# Altium schematic symbol library jlcpcb_2025_04_capacitors_extended_0603.schlib: 3668 symbols (part 9 of 20) (continued)
## CC0603JRNPO0BN391
designator C?  Capacitance: 390pF  (hidden comment: *)
Capacitor, Ceramic (MLCC), 390pF, ±5%, 100V, NP0, ±5%, SMD 0603; Manufacturer: YAGEO; Manufacturer Part Number: CC0603JRNPO0BN391; Package Size: 0603; JLCPCB Basic Part: No; JLCPCB Part Number: C576808; Supplier 1: LCSC; Category: Capacitors - MLCC; Supplier Part Number 1: C576808; Tolerance: ±5%; Voltage Rating: 100V; Temperature Coefficient: NP0; RoHS: Yes; ComponentLink1Description: Datasheet; ComponentLink1URL: https://wmsc.lcsc.com/wmsc/upload/file/pdf/v2/lcsc/2311211121_YAGEO-CC0603JRNPO0BN391_C576808.pdf; ComponentLink2Description: JLCPCB Part URL; ComponentLink2URL: https://jlcpcb.com/partdetail/C576808; ComponentLink3Description: LCSC Part URL; ComponentLink3URL: https://lcsc.com/product-detail/Multilayer-Ceramic-Capacitors-MLCC---SMD-SMT_YAGEO-YAGEO-CC0603JRNPO0BN391_C576808.html
footprint CAP-0603 (0603 (1608M) Capacitor)
pins: 1, 2

## CC0603JRNPO0BN470
designator C?  Capacitance: 47pF  (hidden comment: *)
Capacitor, Ceramic (MLCC), 47pF, ±5%, 100V, NP0, ±5%, SMD 0603; Manufacturer: YAGEO; Manufacturer Part Number: CC0603JRNPO0BN470; Package Size: 0603; JLCPCB Basic Part: No; JLCPCB Part Number: C327115; Supplier 1: LCSC; Category: Capacitors - MLCC; Supplier Part Number 1: C327115; Tolerance: ±5%; Voltage Rating: 100V; Temperature Coefficient: NP0; RoHS: Yes; ComponentLink1Description: Datasheet; ComponentLink1URL: https://wmsc.lcsc.com/wmsc/upload/file/pdf/v2/lcsc/1811141226_YAGEO-CC0603JRNPO0BN470_C327115.pdf; ComponentLink2Description: JLCPCB Part URL; ComponentLink2URL: https://jlcpcb.com/partdetail/C327115; ComponentLink3Description: LCSC Part URL; ComponentLink3URL: https://lcsc.com/product-detail/Multilayer-Ceramic-Capacitors-MLCC---SMD-SMT_YAGEO-YAGEO-CC0603JRNPO0BN470_C327115.html
footprint CAP-0603 (0603 (1608M) Capacitor)
pins: 1, 2

## CC0603JRNPO0BN471
designator C?  Capacitance: 470pF  (hidden comment: *)
Capacitor, Ceramic (MLCC), 470pF, ±5%, 100V, NP0, ±5%, SMD 0603; Manufacturer: YAGEO; Manufacturer Part Number: CC0603JRNPO0BN471; Package Size: 0603; JLCPCB Basic Part: No; JLCPCB Part Number: C326973; Supplier 1: LCSC; Category: Capacitors - MLCC; Supplier Part Number 1: C326973; Tolerance: ±5%; Voltage Rating: 100V; Temperature Coefficient: NP0; RoHS: Yes; ComponentLink1Description: Datasheet; ComponentLink1URL: https://wmsc.lcsc.com/wmsc/upload/file/pdf/v2/lcsc/1811141234_YAGEO-CC0603JRNPO0BN471_C326973.pdf; ComponentLink2Description: JLCPCB Part URL; ComponentLink2URL: https://jlcpcb.com/partdetail/C326973; ComponentLink3Description: LCSC Part URL; ComponentLink3URL: https://lcsc.com/product-detail/Multilayer-Ceramic-Capacitors-MLCC---SMD-SMT_YAGEO-YAGEO-CC0603JRNPO0BN471_C326973.html
footprint CAP-0603 (0603 (1608M) Capacitor)
pins: 1, 2

## CC0603JRNPO0BN510
designator C?  Capacitance: 51pF  (hidden comment: *)
Capacitor, Ceramic (MLCC), 51pF, ±5%, 100V, NP0, ±5%, SMD 0603; Manufacturer: YAGEO; Manufacturer Part Number: CC0603JRNPO0BN510; Package Size: 0603; JLCPCB Basic Part: No; JLCPCB Part Number: C527064; Supplier 1: LCSC; Category: Capacitors - MLCC; Supplier Part Number 1: C527064; Tolerance: ±5%; Voltage Rating: 100V; Temperature Coefficient: NP0; RoHS: Yes; ComponentLink1Description: Datasheet; ComponentLink1URL: https://wmsc.lcsc.com/wmsc/upload/file/pdf/v2/lcsc/2006101834_YAGEO-CC0603JRNPO0BN510_C527064.pdf; ComponentLink2Description: JLCPCB Part URL; ComponentLink2URL: https://jlcpcb.com/partdetail/C527064; ComponentLink3Description: LCSC Part URL; ComponentLink3URL: https://lcsc.com/product-detail/Multilayer-Ceramic-Capacitors-MLCC---SMD-SMT_YAGEO-YAGEO-CC0603JRNPO0BN510_C527064.html
footprint CAP-0603 (0603 (1608M) Capacitor)
pins: 1, 2

## CC0603JRNPO0BN560
designator C?  Capacitance: 56pF  (hidden comment: *)
Capacitor, Ceramic (MLCC), 56pF, ±5%, 100V, NP0, ±5%, SMD 0603; Manufacturer: YAGEO; Manufacturer Part Number: CC0603JRNPO0BN560; Package Size: 0603; JLCPCB Basic Part: No; JLCPCB Part Number: C327031; Supplier 1: LCSC; Category: Capacitors - MLCC; Supplier Part Number 1: C327031; Tolerance: ±5%; Voltage Rating: 100V; Temperature Coefficient: NP0; RoHS: Yes; ComponentLink1Description: Datasheet; ComponentLink1URL: https://wmsc.lcsc.com/wmsc/upload/file/pdf/v2/lcsc/1811141226_YAGEO-CC0603JRNPO0BN560_C327031.pdf; ComponentLink2Description: JLCPCB Part URL; ComponentLink2URL: https://jlcpcb.com/partdetail/C327031; ComponentLink3Description: LCSC Part URL; ComponentLink3URL: https://lcsc.com/product-detail/Multilayer-Ceramic-Capacitors-MLCC---SMD-SMT_YAGEO-YAGEO-CC0603JRNPO0BN560_C327031.html
footprint CAP-0603 (0603 (1608M) Capacitor)
pins: 1, 2

## CC0603JRNPO0BN561
designator C?  Capacitance: 560pF  (hidden comment: *)
Capacitor, Ceramic (MLCC), 560pF, ±5%, 100V, NP0, ±5%, SMD 0603; Manufacturer: YAGEO; Manufacturer Part Number: CC0603JRNPO0BN561; Package Size: 0603; JLCPCB Basic Part: No; JLCPCB Part Number: C513644; Supplier 1: LCSC; Category: Capacitors - MLCC; Supplier Part Number 1: C513644; Tolerance: ±5%; Voltage Rating: 100V; Temperature Coefficient: NP0; RoHS: Yes; ComponentLink1Description: Datasheet; ComponentLink1URL: https://wmsc.lcsc.com/wmsc/upload/file/pdf/v2/lcsc/2004231433_YAGEO-CC0603JRNPO0BN561_C513644.pdf; ComponentLink2Description: JLCPCB Part URL; ComponentLink2URL: https://jlcpcb.com/partdetail/C513644; ComponentLink3Description: LCSC Part URL; ComponentLink3URL: https://lcsc.com/product-detail/Multilayer-Ceramic-Capacitors-MLCC---SMD-SMT_YAGEO-YAGEO-CC0603JRNPO0BN561_C513644.html
footprint CAP-0603 (0603 (1608M) Capacitor)
pins: 1, 2

## CC0603JRNPO0BN680
designator C?  Capacitance: 68pF  (hidden comment: *)
Capacitor, Ceramic (MLCC), 68pF, ±5%, 100V, NP0, ±5%, SMD 0603; Manufacturer: YAGEO; Manufacturer Part Number: CC0603JRNPO0BN680; Package Size: 0603; JLCPCB Basic Part: No; JLCPCB Part Number: C527065; Supplier 1: LCSC; Category: Capacitors - MLCC; Supplier Part Number 1: C527065; Tolerance: ±5%; Voltage Rating: 100V; Temperature Coefficient: NP0; RoHS: Yes; ComponentLink1Description: Datasheet; ComponentLink1URL: https://wmsc.lcsc.com/wmsc/upload/file/pdf/v2/lcsc/2005141733_YAGEO-CC0603JRNPO0BN680_C527065.pdf; ComponentLink2Description: JLCPCB Part URL; ComponentLink2URL: https://jlcpcb.com/partdetail/C527065; ComponentLink3Description: LCSC Part URL; ComponentLink3URL: https://lcsc.com/product-detail/Multilayer-Ceramic-Capacitors-MLCC---SMD-SMT_YAGEO-YAGEO-CC0603JRNPO0BN680_C527065.html
footprint CAP-0603 (0603 (1608M) Capacitor)
pins: 1, 2

## CC0603JRNPO0BN681
designator C?  Capacitance: 680pF  (hidden comment: *)
Capacitor, Ceramic (MLCC), 680pF, ±5%, 100V, NP0, ±5%, SMD 0603; Manufacturer: YAGEO; Manufacturer Part Number: CC0603JRNPO0BN681; Package Size: 0603; JLCPCB Basic Part: No; JLCPCB Part Number: C527066; Supplier 1: LCSC; Category: Capacitors - MLCC; Supplier Part Number 1: C527066; Tolerance: ±5%; Voltage Rating: 100V; Temperature Coefficient: NP0; RoHS: Yes; ComponentLink1Description: Datasheet; ComponentLink1URL: https://wmsc.lcsc.com/wmsc/upload/file/pdf/v2/lcsc/2006101834_YAGEO-CC0603JRNPO0BN681_C527066.pdf; ComponentLink2Description: JLCPCB Part URL; ComponentLink2URL: https://jlcpcb.com/partdetail/C527066; ComponentLink3Description: LCSC Part URL; ComponentLink3URL: https://lcsc.com/product-detail/Multilayer-Ceramic-Capacitors-MLCC---SMD-SMT_YAGEO-YAGEO-CC0603JRNPO0BN681_C527066.html
footprint CAP-0603 (0603 (1608M) Capacitor)
pins: 1, 2

## CC0603JRNPO0BN820
designator C?  Capacitance: 82pF  (hidden comment: *)
Capacitor, Ceramic (MLCC), 82pF, ±5%, 100V, NP0, ±5%, SMD 0603; Manufacturer: YAGEO; Manufacturer Part Number: CC0603JRNPO0BN820; Package Size: 0603; JLCPCB Basic Part: No; JLCPCB Part Number: C113795; Supplier 1: LCSC; Category: Capacitors - MLCC; Supplier Part Number 1: C113795; Tolerance: ±5%; Voltage Rating: 100V; Temperature Coefficient: NP0; RoHS: Yes; ComponentLink1Description: Datasheet; ComponentLink1URL: https://wmsc.lcsc.com/wmsc/upload/file/pdf/v2/lcsc/2304140030_YAGEO-CC0603JRNPO0BN820_C113795.pdf; ComponentLink2Description: JLCPCB Part URL; ComponentLink2URL: https://jlcpcb.com/partdetail/C113795; ComponentLink3Description: LCSC Part URL; ComponentLink3URL: https://lcsc.com/product-detail/Multilayer-Ceramic-Capacitors-MLCC---SMD-SMT_YAGEO-YAGEO-CC0603JRNPO0BN820_C113795.html
footprint CAP-0603 (0603 (1608M) Capacitor)
pins: 1, 2

## CC0603JRNPO0BN821
designator C?  Capacitance: 820pF  (hidden comment: *)
Capacitor, Ceramic (MLCC), 820pF, ±5%, 100V, NP0, ±5%, SMD 0603; Manufacturer: YAGEO; Manufacturer Part Number: CC0603JRNPO0BN821; Package Size: 0603; JLCPCB Basic Part: No; JLCPCB Part Number: C576811; Supplier 1: LCSC; Category: Capacitors - MLCC; Supplier Part Number 1: C576811; Tolerance: ±5%; Voltage Rating: 100V; Temperature Coefficient: NP0; RoHS: Yes; ComponentLink1Description: Datasheet; ComponentLink1URL: https://wmsc.lcsc.com/wmsc/upload/file/pdf/v2/lcsc/2211211800_YAGEO-CC0603JRNPO0BN821_C576811.pdf; ComponentLink2Description: JLCPCB Part URL; ComponentLink2URL: https://jlcpcb.com/partdetail/C576811; ComponentLink3Description: LCSC Part URL; ComponentLink3URL: https://lcsc.com/product-detail/Multilayer-Ceramic-Capacitors-MLCC---SMD-SMT_YAGEO-YAGEO-CC0603JRNPO0BN821_C576811.html
footprint CAP-0603 (0603 (1608M) Capacitor)
pins: 1, 2

## CC0603JRNPO6BN101
designator C?  Capacitance: 100pF  (hidden comment: *)
Capacitor, Ceramic (MLCC), 100pF, ±5%, 10V, NP0, ±5%, SMD 0603; Manufacturer: YAGEO; Manufacturer Part Number: CC0603JRNPO6BN101; Package Size: 0603; JLCPCB Basic Part: No; JLCPCB Part Number: C1853160; Supplier 1: LCSC; Category: Capacitors - MLCC; Supplier Part Number 1: C1853160; Tolerance: ±5%; Voltage Rating: 10V; Temperature Coefficient: NP0; RoHS: Yes; ComponentLink1Description: Datasheet; ComponentLink1URL: https://wmsc.lcsc.com/wmsc/upload/file/pdf/v2/lcsc/2201271030_YAGEO-CC0603JRNPO6BN101_C1853160.pdf; ComponentLink2Description: JLCPCB Part URL; ComponentLink2URL: https://jlcpcb.com/partdetail/C1853160; ComponentLink3Description: LCSC Part URL; ComponentLink3URL: https://lcsc.com/product-detail/Multilayer-Ceramic-Capacitors-MLCC---SMD-SMT_YAGEO-YAGEO-CC0603JRNPO6BN101_C1853160.html
footprint CAP-0603 (0603 (1608M) Capacitor)
pins: 1, 2

## CC0603JRNPO7BN101
designator C?  Capacitance: 100pF  (hidden comment: *)
Capacitor, Ceramic (MLCC), 100pF, ±5%, 16V, NP0, ±5%, SMD 0603; Manufacturer: YAGEO; Manufacturer Part Number: CC0603JRNPO7BN101; Package Size: 0603; JLCPCB Basic Part: No; JLCPCB Part Number: C519386; Supplier 1: LCSC; Category: Capacitors - MLCC; Supplier Part Number 1: C519386; Tolerance: ±5%; Voltage Rating: 16V; Temperature Coefficient: NP0; RoHS: Yes; ComponentLink1Description: Datasheet; ComponentLink1URL: https://wmsc.lcsc.com/wmsc/upload/file/pdf/v2/lcsc/2005181834_YAGEO-CC0603JRNPO7BN101_C519386.pdf; ComponentLink2Description: JLCPCB Part URL; ComponentLink2URL: https://jlcpcb.com/partdetail/C519386; ComponentLink3Description: LCSC Part URL; ComponentLink3URL: https://lcsc.com/product-detail/Multilayer-Ceramic-Capacitors-MLCC---SMD-SMT_YAGEO-YAGEO-CC0603JRNPO7BN101_C519386.html
footprint CAP-0603 (0603 (1608M) Capacitor)
pins: 1, 2

## CC0603JRNPO7BN102
designator C?  Capacitance: 1nF  (hidden comment: *)
Capacitor, Ceramic (MLCC), 1nF, ±5%, 16V, NP0, ±5%, SMD 0603; Manufacturer: YAGEO; Manufacturer Part Number: CC0603JRNPO7BN102; Package Size: 0603; JLCPCB Basic Part: No; JLCPCB Part Number: C726615; Supplier 1: LCSC; Category: Capacitors - MLCC; Supplier Part Number 1: C726615; Tolerance: ±5%; Voltage Rating: 16V; Temperature Coefficient: NP0; RoHS: Yes; ComponentLink1Description: Datasheet; ComponentLink1URL: https://wmsc.lcsc.com/wmsc/upload/file/pdf/v2/lcsc/2304140030_YAGEO-CC0603JRNPO7BN102_C726615.pdf; ComponentLink2Description: JLCPCB Part URL; ComponentLink2URL: https://jlcpcb.com/partdetail/C726615; ComponentLink3Description: LCSC Part URL; ComponentLink3URL: https://lcsc.com/product-detail/Multilayer-Ceramic-Capacitors-MLCC---SMD-SMT_YAGEO-YAGEO-CC0603JRNPO7BN102_C726615.html
footprint CAP-0603 (0603 (1608M) Capacitor)
pins: 1, 2

## CC0603JRNPO7BN200
designator C?  Capacitance: 20pF  (hidden comment: *)
Capacitor, Ceramic (MLCC), 20pF, ±5%, 16V, NP0, ±5%, SMD 0603; Manufacturer: YAGEO; Manufacturer Part Number: CC0603JRNPO7BN200; Package Size: 0603; JLCPCB Basic Part: No; JLCPCB Part Number: C2190570; Supplier 1: LCSC; Category: Capacitors - MLCC; Supplier Part Number 1: C2190570; Tolerance: ±5%; Voltage Rating: 16V; Temperature Coefficient: NP0; RoHS: Yes; ComponentLink1Description: Datasheet; ComponentLink1URL: https://wmsc.lcsc.com/wmsc/upload/file/pdf/v2/lcsc/2304140030_YAGEO-CC0603JRNPO7BN200_C2190570.pdf; ComponentLink2Description: JLCPCB Part URL; ComponentLink2URL: https://jlcpcb.com/partdetail/C2190570; ComponentLink3Description: LCSC Part URL; ComponentLink3URL: https://lcsc.com/product-detail/Multilayer-Ceramic-Capacitors-MLCC---SMD-SMT_YAGEO-YAGEO-CC0603JRNPO7BN200_C2190570.html
footprint CAP-0603 (0603 (1608M) Capacitor)
pins: 1, 2

## CC0603JRNPO7BN272
designator C?  Capacitance: 2.7nF  (hidden comment: *)
Capacitor, Ceramic (MLCC), 2.7nF, ±5%, 16V, NP0, ±5%, SMD 0603; Manufacturer: YAGEO; Manufacturer Part Number: CC0603JRNPO7BN272; Package Size: 0603; JLCPCB Basic Part: No; JLCPCB Part Number: C326881; Supplier 1: LCSC; Category: Capacitors - MLCC; Supplier Part Number 1: C326881; Tolerance: ±5%; Voltage Rating: 16V; Temperature Coefficient: NP0; RoHS: Yes; ComponentLink1Description: Datasheet; ComponentLink1URL: https://wmsc.lcsc.com/wmsc/upload/file/pdf/v2/lcsc/1811141233_YAGEO-CC0603JRNPO7BN272_C326881.pdf; ComponentLink2Description: JLCPCB Part URL; ComponentLink2URL: https://jlcpcb.com/partdetail/C326881; ComponentLink3Description: LCSC Part URL; ComponentLink3URL: https://lcsc.com/product-detail/Multilayer-Ceramic-Capacitors-MLCC---SMD-SMT_YAGEO-YAGEO-CC0603JRNPO7BN272_C326881.html
footprint CAP-0603 (0603 (1608M) Capacitor)
pins: 1, 2

## CC0603JRNPO7BN332
designator C?  Capacitance: 3.3nF  (hidden comment: *)
Capacitor, Ceramic (MLCC), 3.3nF, ±5%, 16V, NP0, ±5%, SMD 0603; Manufacturer: YAGEO; Manufacturer Part Number: CC0603JRNPO7BN332; Package Size: 0603; JLCPCB Basic Part: No; JLCPCB Part Number: C576813; Supplier 1: LCSC; Category: Capacitors - MLCC; Supplier Part Number 1: C576813; Tolerance: ±5%; Voltage Rating: 16V; Temperature Coefficient: NP0; RoHS: Yes; ComponentLink1Description: Datasheet; ComponentLink1URL: https://wmsc.lcsc.com/wmsc/upload/file/pdf/v2/lcsc/2204211700_YAGEO-CC0603JRNPO7BN332_C576813.pdf; ComponentLink2Description: JLCPCB Part URL; ComponentLink2URL: https://jlcpcb.com/partdetail/C576813; ComponentLink3Description: LCSC Part URL; ComponentLink3URL: https://lcsc.com/product-detail/Multilayer-Ceramic-Capacitors-MLCC---SMD-SMT_YAGEO-YAGEO-CC0603JRNPO7BN332_C576813.html
footprint CAP-0603 (0603 (1608M) Capacitor)
pins: 1, 2

## CC0603JRNPO8BN100
designator C?  Capacitance: 10pF  (hidden comment: *)
Capacitor, Ceramic (MLCC), 10pF, ±5%, 25V, NP0, ±5%, SMD 0603; Manufacturer: YAGEO; Manufacturer Part Number: CC0603JRNPO8BN100; Package Size: 0603; JLCPCB Basic Part: No; JLCPCB Part Number: C1853175; Supplier 1: LCSC; Category: Capacitors - MLCC; Supplier Part Number 1: C1853175; Tolerance: ±5%; Voltage Rating: 25V; Temperature Coefficient: NP0; RoHS: Yes; ComponentLink1Description: Datasheet; ComponentLink1URL: https://wmsc.lcsc.com/wmsc/upload/file/pdf/v2/lcsc/2201271030_YAGEO-CC0603JRNPO8BN100_C1853175.pdf; ComponentLink2Description: JLCPCB Part URL; ComponentLink2URL: https://jlcpcb.com/partdetail/C1853175; ComponentLink3Description: LCSC Part URL; ComponentLink3URL: https://lcsc.com/product-detail/Multilayer-Ceramic-Capacitors-MLCC---SMD-SMT_YAGEO-YAGEO-CC0603JRNPO8BN100_C1853175.html
footprint CAP-0603 (0603 (1608M) Capacitor)
pins: 1, 2

## CC0603JRNPO8BN101
designator C?  Capacitance: 100pF  (hidden comment: *)
Capacitor, Ceramic (MLCC), 100pF, ±5%, 25V, NP0, ±5%, SMD 0603; Manufacturer: YAGEO; Manufacturer Part Number: CC0603JRNPO8BN101; Package Size: 0603; JLCPCB Basic Part: No; JLCPCB Part Number: C519387; Supplier 1: LCSC; Category: Capacitors - MLCC; Supplier Part Number 1: C519387; Tolerance: ±5%; Voltage Rating: 25V; Temperature Coefficient: NP0; RoHS: Yes; ComponentLink1Description: Datasheet; ComponentLink1URL: https://wmsc.lcsc.com/wmsc/upload/file/pdf/v2/lcsc/2005181834_YAGEO-CC0603JRNPO8BN101_C519387.pdf; ComponentLink2Description: JLCPCB Part URL; ComponentLink2URL: https://jlcpcb.com/partdetail/C519387; ComponentLink3Description: LCSC Part URL; ComponentLink3URL: https://lcsc.com/product-detail/Multilayer-Ceramic-Capacitors-MLCC---SMD-SMT_YAGEO-YAGEO-CC0603JRNPO8BN101_C519387.html
footprint CAP-0603 (0603 (1608M) Capacitor)
pins: 1, 2

## CC0603JRNPO8BN102
designator C?  Capacitance: 1nF  (hidden comment: *)
Capacitor, Ceramic (MLCC), 1nF, ±5%, 25V, NP0, ±5%, SMD 0603; Manufacturer: YAGEO; Manufacturer Part Number: CC0603JRNPO8BN102; Package Size: 0603; JLCPCB Basic Part: No; JLCPCB Part Number: C309470; Supplier 1: LCSC; Category: Capacitors - MLCC; Supplier Part Number 1: C309470; Tolerance: ±5%; Voltage Rating: 25V; Temperature Coefficient: NP0; RoHS: Yes; ComponentLink1Description: Datasheet; ComponentLink1URL: https://wmsc.lcsc.com/wmsc/upload/file/pdf/v2/lcsc/2304140030_YAGEO-CC0603JRNPO8BN102_C309470.pdf; ComponentLink2Description: JLCPCB Part URL; ComponentLink2URL: https://jlcpcb.com/partdetail/C309470; ComponentLink3Description: LCSC Part URL; ComponentLink3URL: https://lcsc.com/product-detail/Multilayer-Ceramic-Capacitors-MLCC---SMD-SMT_YAGEO-YAGEO-CC0603JRNPO8BN102_C309470.html
footprint CAP-0603 (0603 (1608M) Capacitor)
pins: 1, 2

## CC0603JRNPO8BN103
designator C?  Capacitance: 10nF  (hidden comment: *)
Capacitor, Ceramic (MLCC), 10nF, ±5%, 25V, NP0, ±5%, SMD 0603; Manufacturer: YAGEO; Manufacturer Part Number: CC0603JRNPO8BN103; Package Size: 0603; JLCPCB Basic Part: No; JLCPCB Part Number: C723749; Supplier 1: LCSC; Category: Capacitors - MLCC; Supplier Part Number 1: C723749; Tolerance: ±5%; Voltage Rating: 25V; Temperature Coefficient: NP0; RoHS: Yes; ComponentLink1Description: Datasheet; ComponentLink1URL: https://wmsc.lcsc.com/wmsc/upload/file/pdf/v2/lcsc/2203311730_YAGEO-CC0603JRNPO8BN103_C723749.pdf; ComponentLink2Description: JLCPCB Part URL; ComponentLink2URL: https://jlcpcb.com/partdetail/C723749; ComponentLink3Description: LCSC Part URL; ComponentLink3URL: https://lcsc.com/product-detail/Multilayer-Ceramic-Capacitors-MLCC---SMD-SMT_YAGEO-YAGEO-CC0603JRNPO8BN103_C723749.html
footprint CAP-0603 (0603 (1608M) Capacitor)
pins: 1, 2

## CC0603JRNPO8BN122
designator C?  Capacitance: 1.2nF  (hidden comment: *)
Capacitor, Ceramic (MLCC), 1.2nF, ±5%, 25V, NP0, ±5%, SMD 0603; Manufacturer: YAGEO; Manufacturer Part Number: CC0603JRNPO8BN122; Package Size: 0603; JLCPCB Basic Part: No; JLCPCB Part Number: C527067; Supplier 1: LCSC; Category: Capacitors - MLCC; Supplier Part Number 1: C527067; Tolerance: ±5%; Voltage Rating: 25V; Temperature Coefficient: NP0; RoHS: Yes; ComponentLink1Description: Datasheet; ComponentLink1URL: https://wmsc.lcsc.com/wmsc/upload/file/pdf/v2/lcsc/2006101835_YAGEO-CC0603JRNPO8BN122_C527067.pdf; ComponentLink2Description: JLCPCB Part URL; ComponentLink2URL: https://jlcpcb.com/partdetail/C527067; ComponentLink3Description: LCSC Part URL; ComponentLink3URL: https://lcsc.com/product-detail/Multilayer-Ceramic-Capacitors-MLCC---SMD-SMT_YAGEO-YAGEO-CC0603JRNPO8BN122_C527067.html
footprint CAP-0603 (0603 (1608M) Capacitor)
pins: 1, 2

## CC0603JRNPO8BN150
designator C?  Capacitance: 15pF  (hidden comment: *)
Capacitor, Ceramic (MLCC), 15pF, ±5%, 25V, NP0, ±5%, SMD 0603; Manufacturer: YAGEO; Manufacturer Part Number: CC0603JRNPO8BN150; Package Size: 0603; JLCPCB Basic Part: No; JLCPCB Part Number: C519388; Supplier 1: LCSC; Category: Capacitors - MLCC; Supplier Part Number 1: C519388; Tolerance: ±5%; Voltage Rating: 25V; Temperature Coefficient: NP0; RoHS: Yes; ComponentLink1Description: Datasheet; ComponentLink1URL: https://wmsc.lcsc.com/wmsc/upload/file/pdf/v2/lcsc/2006011834_YAGEO-CC0603JRNPO8BN150_C519388.pdf; ComponentLink2Description: JLCPCB Part URL; ComponentLink2URL: https://jlcpcb.com/partdetail/C519388; ComponentLink3Description: LCSC Part URL; ComponentLink3URL: https://lcsc.com/product-detail/Multilayer-Ceramic-Capacitors-MLCC---SMD-SMT_YAGEO-YAGEO-CC0603JRNPO8BN150_C519388.html
footprint CAP-0603 (0603 (1608M) Capacitor)
pins: 1, 2

## CC0603JRNPO8BN152
designator C?  Capacitance: 1.5nF  (hidden comment: *)
Capacitor, Ceramic (MLCC), 1.5nF, ±5%, 25V, NP0, ±5%, SMD 0603; Manufacturer: YAGEO; Manufacturer Part Number: CC0603JRNPO8BN152; Package Size: 0603; JLCPCB Basic Part: No; JLCPCB Part Number: C576814; Supplier 1: LCSC; Category: Capacitors - MLCC; Supplier Part Number 1: C576814; Tolerance: ±5%; Voltage Rating: 25V; Temperature Coefficient: NP0; RoHS: Yes; ComponentLink1Description: Datasheet; ComponentLink1URL: https://wmsc.lcsc.com/wmsc/upload/file/pdf/v2/lcsc/2007201010_YAGEO-CC0603JRNPO8BN152_C576814.pdf; ComponentLink2Description: JLCPCB Part URL; ComponentLink2URL: https://jlcpcb.com/partdetail/C576814; ComponentLink3Description: LCSC Part URL; ComponentLink3URL: https://lcsc.com/product-detail/Multilayer-Ceramic-Capacitors-MLCC---SMD-SMT_YAGEO-YAGEO-CC0603JRNPO8BN152_C576814.html
footprint CAP-0603 (0603 (1608M) Capacitor)
pins: 1, 2

## CC0603JRNPO8BN180
designator C?  Capacitance: 18pF  (hidden comment: *)
Capacitor, Ceramic (MLCC), 18pF, ±5%, 25V, NP0, ±5%, SMD 0603; Manufacturer: YAGEO; Manufacturer Part Number: CC0603JRNPO8BN180; Package Size: 0603; JLCPCB Basic Part: No; JLCPCB Part Number: C519389; Supplier 1: LCSC; Category: Capacitors - MLCC; Supplier Part Number 1: C519389; Tolerance: ±5%; Voltage Rating: 25V; Temperature Coefficient: NP0; RoHS: Yes; ComponentLink1Description: Datasheet; ComponentLink1URL: https://wmsc.lcsc.com/wmsc/upload/file/pdf/v2/lcsc/2008122133_YAGEO-CC0603JRNPO8BN180_C519389.pdf; ComponentLink2Description: JLCPCB Part URL; ComponentLink2URL: https://jlcpcb.com/partdetail/C519389; ComponentLink3Description: LCSC Part URL; ComponentLink3URL: https://lcsc.com/product-detail/Multilayer-Ceramic-Capacitors-MLCC---SMD-SMT_YAGEO-YAGEO-CC0603JRNPO8BN180_C519389.html
footprint CAP-0603 (0603 (1608M) Capacitor)
pins: 1, 2

## CC0603JRNPO8BN220
designator C?  Capacitance: 22pF  (hidden comment: *)
Capacitor, Ceramic (MLCC), 22pF, ±5%, 25V, NP0, ±5%, SMD 0603; Manufacturer: YAGEO; Manufacturer Part Number: CC0603JRNPO8BN220; Package Size: 0603; JLCPCB Basic Part: No; JLCPCB Part Number: C519390; Supplier 1: LCSC; Category: Capacitors - MLCC; Supplier Part Number 1: C519390; Tolerance: ±5%; Voltage Rating: 25V; Temperature Coefficient: NP0; RoHS: Yes; ComponentLink1Description: Datasheet; ComponentLink1URL: https://wmsc.lcsc.com/wmsc/upload/file/pdf/v2/lcsc/2005181834_YAGEO-CC0603JRNPO8BN220_C519390.pdf; ComponentLink2Description: JLCPCB Part URL; ComponentLink2URL: https://jlcpcb.com/partdetail/C519390; ComponentLink3Description: LCSC Part URL; ComponentLink3URL: https://lcsc.com/product-detail/Multilayer-Ceramic-Capacitors-MLCC---SMD-SMT_YAGEO-YAGEO-CC0603JRNPO8BN220_C519390.html
footprint CAP-0603 (0603 (1608M) Capacitor)
pins: 1, 2

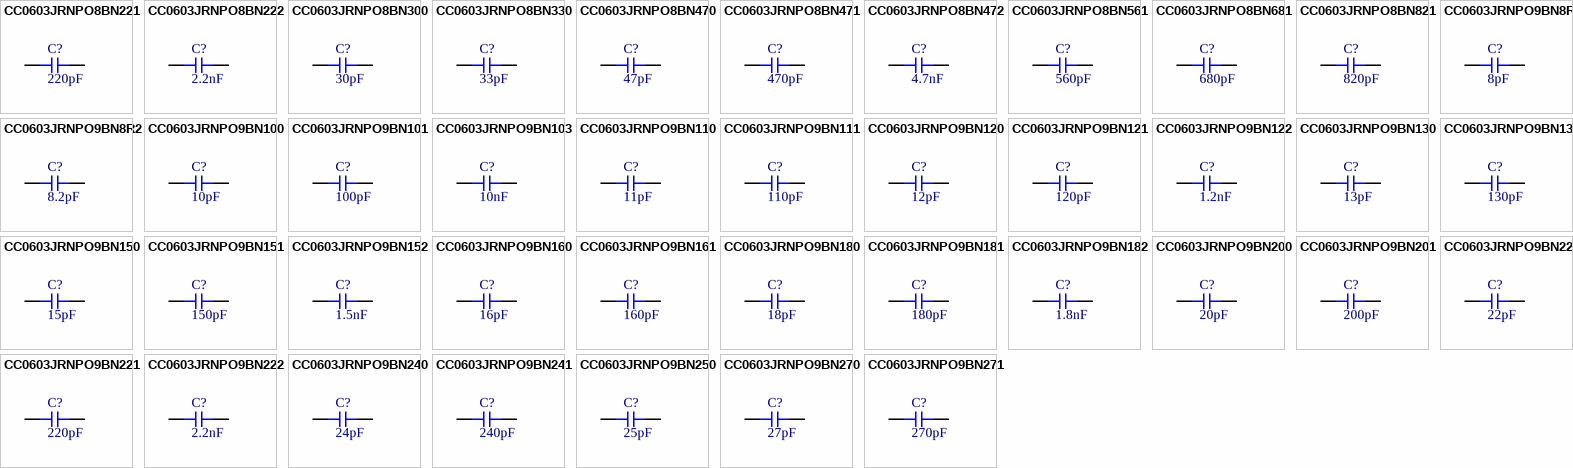
[diagram p40: symbols CC0603JRNPO8BN221 to CC0603JRNPO9BN271]

## CC0603JRNPO8BN221
designator C?  Capacitance: 220pF  (hidden comment: *)
Capacitor, Ceramic (MLCC), 220pF, ±5%, 25V, NP0, ±5%, SMD 0603; Manufacturer: YAGEO; Manufacturer Part Number: CC0603JRNPO8BN221; Package Size: 0603; JLCPCB Basic Part: No; JLCPCB Part Number: C519394; Supplier 1: LCSC; Category: Capacitors - MLCC; Supplier Part Number 1: C519394; Tolerance: ±5%; Voltage Rating: 25V; Temperature Coefficient: NP0; RoHS: Yes; ComponentLink1Description: Datasheet; ComponentLink1URL: https://wmsc.lcsc.com/wmsc/upload/file/pdf/v2/lcsc/2006011834_YAGEO-CC0603JRNPO8BN221_C519394.pdf; ComponentLink2Description: JLCPCB Part URL; ComponentLink2URL: https://jlcpcb.com/partdetail/C519394; ComponentLink3Description: LCSC Part URL; ComponentLink3URL: https://lcsc.com/product-detail/Multilayer-Ceramic-Capacitors-MLCC---SMD-SMT_YAGEO-YAGEO-CC0603JRNPO8BN221_C519394.html
footprint CAP-0603 (0603 (1608M) Capacitor)
pins: 1, 2

## CC0603JRNPO8BN222
designator C?  Capacitance: 2.2nF  (hidden comment: *)
Capacitor, Ceramic (MLCC), 2.2nF, ±5%, 25V, NP0, ±5%, SMD 0603; Manufacturer: YAGEO; Manufacturer Part Number: CC0603JRNPO8BN222; Package Size: 0603; JLCPCB Basic Part: No; JLCPCB Part Number: C309471; Supplier 1: LCSC; Category: Capacitors - MLCC; Supplier Part Number 1: C309471; Tolerance: ±5%; Voltage Rating: 25V; Temperature Coefficient: NP0; RoHS: Yes; ComponentLink1Description: Datasheet; ComponentLink1URL: https://wmsc.lcsc.com/wmsc/upload/file/pdf/v2/lcsc/2304140030_YAGEO-CC0603JRNPO8BN222_C309471.pdf; ComponentLink2Description: JLCPCB Part URL; ComponentLink2URL: https://jlcpcb.com/partdetail/C309471; ComponentLink3Description: LCSC Part URL; ComponentLink3URL: https://lcsc.com/product-detail/Multilayer-Ceramic-Capacitors-MLCC---SMD-SMT_YAGEO-YAGEO-CC0603JRNPO8BN222_C309471.html
footprint CAP-0603 (0603 (1608M) Capacitor)
pins: 1, 2

## CC0603JRNPO8BN300
designator C?  Capacitance: 30pF  (hidden comment: *)
Capacitor, Ceramic (MLCC), 30pF, ±5%, 25V, NP0, ±5%, SMD 0603; Manufacturer: YAGEO; Manufacturer Part Number: CC0603JRNPO8BN300; Package Size: 0603; JLCPCB Basic Part: No; JLCPCB Part Number: C1853723; Supplier 1: LCSC; Category: Capacitors - MLCC; Supplier Part Number 1: C1853723; Tolerance: ±5%; Voltage Rating: 25V; Temperature Coefficient: NP0; RoHS: Yes; ComponentLink1Description: Datasheet; ComponentLink1URL: https://wmsc.lcsc.com/wmsc/upload/file/pdf/v2/lcsc/2201271100_YAGEO-CC0603JRNPO8BN300_C1853723.pdf; ComponentLink2Description: JLCPCB Part URL; ComponentLink2URL: https://jlcpcb.com/partdetail/C1853723; ComponentLink3Description: LCSC Part URL; ComponentLink3URL: https://lcsc.com/product-detail/Multilayer-Ceramic-Capacitors-MLCC---SMD-SMT_YAGEO-YAGEO-CC0603JRNPO8BN300_C1853723.html
footprint CAP-0603 (0603 (1608M) Capacitor)
pins: 1, 2

## CC0603JRNPO8BN330
designator C?  Capacitance: 33pF  (hidden comment: *)
Capacitor, Ceramic (MLCC), 33pF, ±5%, 25V, NP0, ±5%, SMD 0603; Manufacturer: YAGEO; Manufacturer Part Number: CC0603JRNPO8BN330; Package Size: 0603; JLCPCB Basic Part: No; JLCPCB Part Number: C519391; Supplier 1: LCSC; Category: Capacitors - MLCC; Supplier Part Number 1: C519391; Tolerance: ±5%; Voltage Rating: 25V; Temperature Coefficient: NP0; RoHS: Yes; ComponentLink1Description: Datasheet; ComponentLink1URL: https://wmsc.lcsc.com/wmsc/upload/file/pdf/v2/lcsc/2005181834_YAGEO-CC0603JRNPO8BN330_C519391.pdf; ComponentLink2Description: JLCPCB Part URL; ComponentLink2URL: https://jlcpcb.com/partdetail/C519391; ComponentLink3Description: LCSC Part URL; ComponentLink3URL: https://lcsc.com/product-detail/Multilayer-Ceramic-Capacitors-MLCC---SMD-SMT_YAGEO-YAGEO-CC0603JRNPO8BN330_C519391.html
footprint CAP-0603 (0603 (1608M) Capacitor)
pins: 1, 2

## CC0603JRNPO8BN470
designator C?  Capacitance: 47pF  (hidden comment: *)
Capacitor, Ceramic (MLCC), 47pF, ±5%, 25V, NP0, ±5%, SMD 0603; Manufacturer: YAGEO; Manufacturer Part Number: CC0603JRNPO8BN470; Package Size: 0603; JLCPCB Basic Part: No; JLCPCB Part Number: C519392; Supplier 1: LCSC; Category: Capacitors - MLCC; Supplier Part Number 1: C519392; Tolerance: ±5%; Voltage Rating: 25V; Temperature Coefficient: NP0; RoHS: Yes; ComponentLink1Description: Datasheet; ComponentLink1URL: https://wmsc.lcsc.com/wmsc/upload/file/pdf/v2/lcsc/2005181834_YAGEO-CC0603JRNPO8BN470_C519392.pdf; ComponentLink2Description: JLCPCB Part URL; ComponentLink2URL: https://jlcpcb.com/partdetail/C519392; ComponentLink3Description: LCSC Part URL; ComponentLink3URL: https://lcsc.com/product-detail/Multilayer-Ceramic-Capacitors-MLCC---SMD-SMT_YAGEO-YAGEO-CC0603JRNPO8BN470_C519392.html
footprint CAP-0603 (0603 (1608M) Capacitor)
pins: 1, 2

## CC0603JRNPO8BN471
designator C?  Capacitance: 470pF  (hidden comment: *)
Capacitor, Ceramic (MLCC), 470pF, ±5%, 25V, NP0, ±5%, SMD 0603; Manufacturer: YAGEO; Manufacturer Part Number: CC0603JRNPO8BN471; Package Size: 0603; JLCPCB Basic Part: No; JLCPCB Part Number: C519395; Supplier 1: LCSC; Category: Capacitors - MLCC; Supplier Part Number 1: C519395; Tolerance: ±5%; Voltage Rating: 25V; Temperature Coefficient: NP0; RoHS: Yes; ComponentLink1Description: Datasheet; ComponentLink1URL: https://wmsc.lcsc.com/wmsc/upload/file/pdf/v2/lcsc/2006011834_YAGEO-CC0603JRNPO8BN471_C519395.pdf; ComponentLink2Description: JLCPCB Part URL; ComponentLink2URL: https://jlcpcb.com/partdetail/C519395; ComponentLink3Description: LCSC Part URL; ComponentLink3URL: https://lcsc.com/product-detail/Multilayer-Ceramic-Capacitors-MLCC---SMD-SMT_YAGEO-YAGEO-CC0603JRNPO8BN471_C519395.html
footprint CAP-0603 (0603 (1608M) Capacitor)
pins: 1, 2

## CC0603JRNPO8BN472
designator C?  Capacitance: 4.7nF  (hidden comment: *)
Capacitor, Ceramic (MLCC), 4.7nF, ±5%, 25V, NP0, ±5%, SMD 0603; Manufacturer: YAGEO; Manufacturer Part Number: CC0603JRNPO8BN472; Package Size: 0603; JLCPCB Basic Part: No; JLCPCB Part Number: C576815; Supplier 1: LCSC; Category: Capacitors - MLCC; Supplier Part Number 1: C576815; Tolerance: ±5%; Voltage Rating: 25V; Temperature Coefficient: NP0; RoHS: Yes; ComponentLink1Description: Datasheet; ComponentLink1URL: https://wmsc.lcsc.com/wmsc/upload/file/pdf/v2/lcsc/2204211700_YAGEO-CC0603JRNPO8BN472_C576815.pdf; ComponentLink2Description: JLCPCB Part URL; ComponentLink2URL: https://jlcpcb.com/partdetail/C576815; ComponentLink3Description: LCSC Part URL; ComponentLink3URL: https://lcsc.com/product-detail/Multilayer-Ceramic-Capacitors-MLCC---SMD-SMT_YAGEO-YAGEO-CC0603JRNPO8BN472_C576815.html
footprint CAP-0603 (0603 (1608M) Capacitor)
pins: 1, 2

## CC0603JRNPO8BN561
designator C?  Capacitance: 560pF  (hidden comment: *)
Capacitor, Ceramic (MLCC), 560pF, ±5%, 25V, NP0, ±5%, SMD 0603; Manufacturer: YAGEO; Manufacturer Part Number: CC0603JRNPO8BN561; Package Size: 0603; JLCPCB Basic Part: No; JLCPCB Part Number: C519396; Supplier 1: LCSC; Category: Capacitors - MLCC; Supplier Part Number 1: C519396; Tolerance: ±5%; Voltage Rating: 25V; Temperature Coefficient: NP0; RoHS: Yes; ComponentLink1Description: Datasheet; ComponentLink1URL: https://wmsc.lcsc.com/wmsc/upload/file/pdf/v2/lcsc/2008191833_YAGEO-CC0603JRNPO8BN561_C519396.pdf; ComponentLink2Description: JLCPCB Part URL; ComponentLink2URL: https://jlcpcb.com/partdetail/C519396; ComponentLink3Description: LCSC Part URL; ComponentLink3URL: https://lcsc.com/product-detail/Multilayer-Ceramic-Capacitors-MLCC---SMD-SMT_YAGEO-YAGEO-CC0603JRNPO8BN561_C519396.html
footprint CAP-0603 (0603 (1608M) Capacitor)
pins: 1, 2

## CC0603JRNPO8BN681
designator C?  Capacitance: 680pF  (hidden comment: *)
Capacitor, Ceramic (MLCC), 680pF, ±5%, 25V, NP0, ±5%, SMD 0603; Manufacturer: YAGEO; Manufacturer Part Number: CC0603JRNPO8BN681; Package Size: 0603; JLCPCB Basic Part: No; JLCPCB Part Number: C519397; Supplier 1: LCSC; Category: Capacitors - MLCC; Supplier Part Number 1: C519397; Tolerance: ±5%; Voltage Rating: 25V; Temperature Coefficient: NP0; RoHS: Yes; ComponentLink1Description: Datasheet; ComponentLink1URL: https://wmsc.lcsc.com/wmsc/upload/file/pdf/v2/lcsc/2304140030_YAGEO-CC0603JRNPO8BN681_C519397.pdf; ComponentLink2Description: JLCPCB Part URL; ComponentLink2URL: https://jlcpcb.com/partdetail/C519397; ComponentLink3Description: LCSC Part URL; ComponentLink3URL: https://lcsc.com/product-detail/Multilayer-Ceramic-Capacitors-MLCC---SMD-SMT_YAGEO-YAGEO-CC0603JRNPO8BN681_C519397.html
footprint CAP-0603 (0603 (1608M) Capacitor)
pins: 1, 2

## CC0603JRNPO8BN821
designator C?  Capacitance: 820pF  (hidden comment: *)
Capacitor, Ceramic (MLCC), 820pF, ±5%, 25V, NP0, ±5%, SMD 0603; Manufacturer: YAGEO; Manufacturer Part Number: CC0603JRNPO8BN821; Package Size: 0603; JLCPCB Basic Part: No; JLCPCB Part Number: C519398; Supplier 1: LCSC; Category: Capacitors - MLCC; Supplier Part Number 1: C519398; Tolerance: ±5%; Voltage Rating: 25V; Temperature Coefficient: NP0; RoHS: Yes; ComponentLink1Description: Datasheet; ComponentLink1URL: https://wmsc.lcsc.com/wmsc/upload/file/pdf/v2/lcsc/2008051834_YAGEO-CC0603JRNPO8BN821_C519398.pdf; ComponentLink2Description: JLCPCB Part URL; ComponentLink2URL: https://jlcpcb.com/partdetail/C519398; ComponentLink3Description: LCSC Part URL; ComponentLink3URL: https://lcsc.com/product-detail/Multilayer-Ceramic-Capacitors-MLCC---SMD-SMT_YAGEO-YAGEO-CC0603JRNPO8BN821_C519398.html
footprint CAP-0603 (0603 (1608M) Capacitor)
pins: 1, 2

## CC0603JRNPO9BN8R0
designator C?  Capacitance: 8pF  (hidden comment: *)
Capacitor, Ceramic (MLCC), 8pF, ±5%, 50V, NP0, ±5%, SMD 0603; Manufacturer: YAGEO; Manufacturer Part Number: CC0603JRNPO9BN8R0; Package Size: 0603; JLCPCB Basic Part: No; JLCPCB Part Number: C1882476; Supplier 1: LCSC; Category: Capacitors - MLCC; Supplier Part Number 1: C1882476; Tolerance: ±5%; Voltage Rating: 50V; Temperature Coefficient: NP0; RoHS: Yes; ComponentLink1Description: Datasheet; ComponentLink1URL: https://wmsc.lcsc.com/wmsc/upload/file/pdf/v2/lcsc/2201280400_YAGEO-CC0603JRNPO9BN8R0_C1882476.pdf; ComponentLink2Description: JLCPCB Part URL; ComponentLink2URL: https://jlcpcb.com/partdetail/C1882476; ComponentLink3Description: LCSC Part URL; ComponentLink3URL: https://lcsc.com/product-detail/Multilayer-Ceramic-Capacitors-MLCC---SMD-SMT_YAGEO-YAGEO-CC0603JRNPO9BN8R0_C1882476.html
footprint CAP-0603 (0603 (1608M) Capacitor)
pins: 1, 2

## CC0603JRNPO9BN8R2
designator C?  Capacitance: 8.2pF  (hidden comment: *)
Capacitor, Ceramic (MLCC), 8.2pF, ±5%, 50V, NP0, ±5%, SMD 0603; Manufacturer: YAGEO; Manufacturer Part Number: CC0603JRNPO9BN8R2; Package Size: 0603; JLCPCB Basic Part: No; JLCPCB Part Number: C962145; Supplier 1: LCSC; Category: Capacitors - MLCC; Supplier Part Number 1: C962145; Tolerance: ±5%; Voltage Rating: 50V; Temperature Coefficient: NP0; RoHS: Yes; ComponentLink1Description: Datasheet; ComponentLink1URL: https://wmsc.lcsc.com/wmsc/upload/file/pdf/v2/lcsc/2201242100_YAGEO-CC0603JRNPO9BN8R2_C962145.pdf; ComponentLink2Description: JLCPCB Part URL; ComponentLink2URL: https://jlcpcb.com/partdetail/C962145; ComponentLink3Description: LCSC Part URL; ComponentLink3URL: https://lcsc.com/product-detail/Multilayer-Ceramic-Capacitors-MLCC---SMD-SMT_YAGEO-YAGEO-CC0603JRNPO9BN8R2_C962145.html
footprint CAP-0603 (0603 (1608M) Capacitor)
pins: 1, 2

## CC0603JRNPO9BN100
designator C?  Capacitance: 10pF  (hidden comment: *)
Capacitor, Ceramic (MLCC), 10pF, ±5%, 50V, NP0, ±5%, SMD 0603; Manufacturer: YAGEO; Manufacturer Part Number: CC0603JRNPO9BN100; Package Size: 0603; JLCPCB Basic Part: No; JLCPCB Part Number: C106245; Supplier 1: LCSC; Category: Capacitors - MLCC; Supplier Part Number 1: C106245; Tolerance: ±5%; Voltage Rating: 50V; Temperature Coefficient: NP0; RoHS: Yes; ComponentLink1Description: Datasheet; ComponentLink1URL: https://wmsc.lcsc.com/wmsc/upload/file/pdf/v2/lcsc/2304140030_YAGEO-CC0603JRNPO9BN100_C106245.pdf; ComponentLink2Description: JLCPCB Part URL; ComponentLink2URL: https://jlcpcb.com/partdetail/C106245; ComponentLink3Description: LCSC Part URL; ComponentLink3URL: https://lcsc.com/product-detail/Multilayer-Ceramic-Capacitors-MLCC---SMD-SMT_YAGEO-YAGEO-CC0603JRNPO9BN100_C106245.html
footprint CAP-0603 (0603 (1608M) Capacitor)
pins: 1, 2

## CC0603JRNPO9BN101
designator C?  Capacitance: 100pF  (hidden comment: *)
Capacitor, Ceramic (MLCC), 100pF, ±5%, 50V, NP0, ±5%, SMD 0603; Manufacturer: YAGEO; Manufacturer Part Number: CC0603JRNPO9BN101; Package Size: 0603; JLCPCB Basic Part: No; JLCPCB Part Number: C14665; Supplier 1: LCSC; Category: Capacitors - MLCC; Supplier Part Number 1: C14665; Tolerance: ±5%; Voltage Rating: 50V; Temperature Coefficient: NP0; RoHS: Yes; ComponentLink1Description: Datasheet; ComponentLink1URL: https://wmsc.lcsc.com/wmsc/upload/file/pdf/v2/lcsc/2304140030_YAGEO-CC0603JRNPO9BN101_C14665.pdf; ComponentLink2Description: JLCPCB Part URL; ComponentLink2URL: https://jlcpcb.com/partdetail/C14665; ComponentLink3Description: LCSC Part URL; ComponentLink3URL: https://lcsc.com/product-detail/Multilayer-Ceramic-Capacitors-MLCC---SMD-SMT_YAGEO-YAGEO-CC0603JRNPO9BN101_C14665.html
footprint CAP-0603 (0603 (1608M) Capacitor)
pins: 1, 2

## CC0603JRNPO9BN103
designator C?  Capacitance: 10nF  (hidden comment: *)
Capacitor, Ceramic (MLCC), 10nF, ±5%, 50V, NP0, ±5%, SMD 0603; Manufacturer: YAGEO; Manufacturer Part Number: CC0603JRNPO9BN103; Package Size: 0603; JLCPCB Basic Part: No; JLCPCB Part Number: C389113; Supplier 1: LCSC; Category: Capacitors - MLCC; Supplier Part Number 1: C389113; Tolerance: ±5%; Voltage Rating: 50V; Temperature Coefficient: NP0; RoHS: Yes; ComponentLink1Description: Datasheet; ComponentLink1URL: https://wmsc.lcsc.com/wmsc/upload/file/pdf/v2/lcsc/1912111437_YAGEO-CC0603JRNPO9BN103_C389113.pdf; ComponentLink2Description: JLCPCB Part URL; ComponentLink2URL: https://jlcpcb.com/partdetail/C389113; ComponentLink3Description: LCSC Part URL; ComponentLink3URL: https://lcsc.com/product-detail/Multilayer-Ceramic-Capacitors-MLCC---SMD-SMT_YAGEO-YAGEO-CC0603JRNPO9BN103_C389113.html
footprint CAP-0603 (0603 (1608M) Capacitor)
pins: 1, 2

## CC0603JRNPO9BN110
designator C?  Capacitance: 11pF  (hidden comment: *)
Capacitor, Ceramic (MLCC), 11pF, ±5%, 50V, NP0, ±5%, SMD 0603; Manufacturer: YAGEO; Manufacturer Part Number: CC0603JRNPO9BN110; Package Size: 0603; JLCPCB Basic Part: No; JLCPCB Part Number: C519393; Supplier 1: LCSC; Category: Capacitors - MLCC; Supplier Part Number 1: C519393; Tolerance: ±5%; Voltage Rating: 50V; Temperature Coefficient: NP0; RoHS: Yes; ComponentLink1Description: Datasheet; ComponentLink1URL: https://wmsc.lcsc.com/wmsc/upload/file/pdf/v2/lcsc/2005141203_YAGEO-CC0603JRNPO9BN110_C519393.pdf; ComponentLink2Description: JLCPCB Part URL; ComponentLink2URL: https://jlcpcb.com/partdetail/C519393; ComponentLink3Description: LCSC Part URL; ComponentLink3URL: https://lcsc.com/product-detail/Multilayer-Ceramic-Capacitors-MLCC---SMD-SMT_YAGEO-YAGEO-CC0603JRNPO9BN110_C519393.html
footprint CAP-0603 (0603 (1608M) Capacitor)
pins: 1, 2

## CC0603JRNPO9BN111
designator C?  Capacitance: 110pF  (hidden comment: *)
Capacitor, Ceramic (MLCC), 110pF, ±5%, 50V, NP0, ±5%, SMD 0603; Manufacturer: YAGEO; Manufacturer Part Number: CC0603JRNPO9BN111; Package Size: 0603; JLCPCB Basic Part: No; JLCPCB Part Number: C327208; Supplier 1: LCSC; Category: Capacitors - MLCC; Supplier Part Number 1: C327208; Tolerance: ±5%; Voltage Rating: 50V; Temperature Coefficient: NP0; RoHS: Yes; ComponentLink1Description: Datasheet; ComponentLink1URL: https://wmsc.lcsc.com/wmsc/upload/file/pdf/v2/lcsc/1811141233_YAGEO-CC0603JRNPO9BN111_C327208.pdf; ComponentLink2Description: JLCPCB Part URL; ComponentLink2URL: https://jlcpcb.com/partdetail/C327208; ComponentLink3Description: LCSC Part URL; ComponentLink3URL: https://lcsc.com/product-detail/Multilayer-Ceramic-Capacitors-MLCC---SMD-SMT_YAGEO-YAGEO-CC0603JRNPO9BN111_C327208.html
footprint CAP-0603 (0603 (1608M) Capacitor)
pins: 1, 2

## CC0603JRNPO9BN120
designator C?  Capacitance: 12pF  (hidden comment: *)
Capacitor, Ceramic (MLCC), 12pF, ±5%, 50V, NP0, ±5%, SMD 0603; Manufacturer: YAGEO; Manufacturer Part Number: CC0603JRNPO9BN120; Package Size: 0603; JLCPCB Basic Part: No; JLCPCB Part Number: C107034; Supplier 1: LCSC; Category: Capacitors - MLCC; Supplier Part Number 1: C107034; Tolerance: ±5%; Voltage Rating: 50V; Temperature Coefficient: NP0; RoHS: Yes; ComponentLink1Description: Datasheet; ComponentLink1URL: https://wmsc.lcsc.com/wmsc/upload/file/pdf/v2/lcsc/2304140030_YAGEO-CC0603JRNPO9BN120_C107034.pdf; ComponentLink2Description: JLCPCB Part URL; ComponentLink2URL: https://jlcpcb.com/partdetail/C107034; ComponentLink3Description: LCSC Part URL; ComponentLink3URL: https://lcsc.com/product-detail/Multilayer-Ceramic-Capacitors-MLCC---SMD-SMT_YAGEO-YAGEO-CC0603JRNPO9BN120_C107034.html
footprint CAP-0603 (0603 (1608M) Capacitor)
pins: 1, 2

## CC0603JRNPO9BN121
designator C?  Capacitance: 120pF  (hidden comment: *)
Capacitor, Ceramic (MLCC), 120pF, ±5%, 50V, NP0, ±5%, SMD 0603; Manufacturer: YAGEO; Manufacturer Part Number: CC0603JRNPO9BN121; Package Size: 0603; JLCPCB Basic Part: No; JLCPCB Part Number: C107035; Supplier 1: LCSC; Category: Capacitors - MLCC; Supplier Part Number 1: C107035; Tolerance: ±5%; Voltage Rating: 50V; Temperature Coefficient: NP0; RoHS: Yes; ComponentLink1Description: Datasheet; ComponentLink1URL: https://wmsc.lcsc.com/wmsc/upload/file/pdf/v2/lcsc/2304140030_YAGEO-CC0603JRNPO9BN121_C107035.pdf; ComponentLink2Description: JLCPCB Part URL; ComponentLink2URL: https://jlcpcb.com/partdetail/C107035; ComponentLink3Description: LCSC Part URL; ComponentLink3URL: https://lcsc.com/product-detail/Multilayer-Ceramic-Capacitors-MLCC---SMD-SMT_YAGEO-YAGEO-CC0603JRNPO9BN121_C107035.html
footprint CAP-0603 (0603 (1608M) Capacitor)
pins: 1, 2

## CC0603JRNPO9BN122
designator C?  Capacitance: 1.2nF  (hidden comment: *)
Capacitor, Ceramic (MLCC), 1.2nF, ±5%, 50V, NP0, ±5%, SMD 0603; Manufacturer: YAGEO; Manufacturer Part Number: CC0603JRNPO9BN122; Package Size: 0603; JLCPCB Basic Part: No; JLCPCB Part Number: C576816; Supplier 1: LCSC; Category: Capacitors - MLCC; Supplier Part Number 1: C576816; Tolerance: ±5%; Voltage Rating: 50V; Temperature Coefficient: NP0; RoHS: Yes; ComponentLink1Description: Datasheet; ComponentLink1URL: https://wmsc.lcsc.com/wmsc/upload/file/pdf/v2/lcsc/2008061233_YAGEO-CC0603JRNPO9BN122_C576816.pdf; ComponentLink2Description: JLCPCB Part URL; ComponentLink2URL: https://jlcpcb.com/partdetail/C576816; ComponentLink3Description: LCSC Part URL; ComponentLink3URL: https://lcsc.com/product-detail/Multilayer-Ceramic-Capacitors-MLCC---SMD-SMT_YAGEO-YAGEO-CC0603JRNPO9BN122_C576816.html
footprint CAP-0603 (0603 (1608M) Capacitor)
pins: 1, 2

## CC0603JRNPO9BN130
designator C?  Capacitance: 13pF  (hidden comment: *)
Capacitor, Ceramic (MLCC), 13pF, ±5%, 50V, NP0, ±5%, SMD 0603; Manufacturer: YAGEO; Manufacturer Part Number: CC0603JRNPO9BN130; Package Size: 0603; JLCPCB Basic Part: No; JLCPCB Part Number: C107036; Supplier 1: LCSC; Category: Capacitors - MLCC; Supplier Part Number 1: C107036; Tolerance: ±5%; Voltage Rating: 50V; Temperature Coefficient: NP0; RoHS: Yes; ComponentLink1Description: Datasheet; ComponentLink1URL: https://wmsc.lcsc.com/wmsc/upload/file/pdf/v2/lcsc/2304140030_YAGEO-CC0603JRNPO9BN130_C107036.pdf; ComponentLink2Description: JLCPCB Part URL; ComponentLink2URL: https://jlcpcb.com/partdetail/C107036; ComponentLink3Description: LCSC Part URL; ComponentLink3URL: https://lcsc.com/product-detail/Multilayer-Ceramic-Capacitors-MLCC---SMD-SMT_YAGEO-YAGEO-CC0603JRNPO9BN130_C107036.html
footprint CAP-0603 (0603 (1608M) Capacitor)
pins: 1, 2

## CC0603JRNPO9BN131
designator C?  Capacitance: 130pF  (hidden comment: *)
Capacitor, Ceramic (MLCC), 130pF, ±5%, 50V, NP0, ±5%, SMD 0603; Manufacturer: YAGEO; Manufacturer Part Number: CC0603JRNPO9BN131; Package Size: 0603; JLCPCB Basic Part: No; JLCPCB Part Number: C519399; Supplier 1: LCSC; Category: Capacitors - MLCC; Supplier Part Number 1: C519399; Tolerance: ±5%; Voltage Rating: 50V; Temperature Coefficient: NP0; RoHS: Yes; ComponentLink1Description: Datasheet; ComponentLink1URL: https://wmsc.lcsc.com/wmsc/upload/file/pdf/v2/lcsc/2007231533_YAGEO-CC0603JRNPO9BN131_C519399.pdf; ComponentLink2Description: JLCPCB Part URL; ComponentLink2URL: https://jlcpcb.com/partdetail/C519399; ComponentLink3Description: LCSC Part URL; ComponentLink3URL: https://lcsc.com/product-detail/Multilayer-Ceramic-Capacitors-MLCC---SMD-SMT_YAGEO-YAGEO-CC0603JRNPO9BN131_C519399.html
footprint CAP-0603 (0603 (1608M) Capacitor)
pins: 1, 2

## CC0603JRNPO9BN150
designator C?  Capacitance: 15pF  (hidden comment: *)
Capacitor, Ceramic (MLCC), 15pF, ±5%, 50V, NP0, ±5%, SMD 0603; Manufacturer: YAGEO; Manufacturer Part Number: CC0603JRNPO9BN150; Package Size: 0603; JLCPCB Basic Part: No; JLCPCB Part Number: C107037; Supplier 1: LCSC; Category: Capacitors - MLCC; Supplier Part Number 1: C107037; Tolerance: ±5%; Voltage Rating: 50V; Temperature Coefficient: NP0; RoHS: Yes; ComponentLink1Description: Datasheet; ComponentLink1URL: https://wmsc.lcsc.com/wmsc/upload/file/pdf/v2/lcsc/2304140030_YAGEO-CC0603JRNPO9BN150_C107037.pdf; ComponentLink2Description: JLCPCB Part URL; ComponentLink2URL: https://jlcpcb.com/partdetail/C107037; ComponentLink3Description: LCSC Part URL; ComponentLink3URL: https://lcsc.com/product-detail/Multilayer-Ceramic-Capacitors-MLCC---SMD-SMT_YAGEO-YAGEO-CC0603JRNPO9BN150_C107037.html
footprint CAP-0603 (0603 (1608M) Capacitor)
pins: 1, 2

## CC0603JRNPO9BN151
designator C?  Capacitance: 150pF  (hidden comment: *)
Capacitor, Ceramic (MLCC), 150pF, ±5%, 50V, NP0, ±5%, SMD 0603; Manufacturer: YAGEO; Manufacturer Part Number: CC0603JRNPO9BN151; Package Size: 0603; JLCPCB Basic Part: No; JLCPCB Part Number: C107038; Supplier 1: LCSC; Category: Capacitors - MLCC; Supplier Part Number 1: C107038; Tolerance: ±5%; Voltage Rating: 50V; Temperature Coefficient: NP0; RoHS: Yes; ComponentLink1Description: Datasheet; ComponentLink1URL: https://wmsc.lcsc.com/wmsc/upload/file/pdf/v2/lcsc/2304140030_YAGEO-CC0603JRNPO9BN151_C107038.pdf; ComponentLink2Description: JLCPCB Part URL; ComponentLink2URL: https://jlcpcb.com/partdetail/C107038; ComponentLink3Description: LCSC Part URL; ComponentLink3URL: https://lcsc.com/product-detail/Multilayer-Ceramic-Capacitors-MLCC---SMD-SMT_YAGEO-YAGEO-CC0603JRNPO9BN151_C107038.html
footprint CAP-0603 (0603 (1608M) Capacitor)
pins: 1, 2
